# Altium footprint library SMotlaq-PCB_lib.PcbLib: 186 footprints (part 3 of 12)
Each footprint in its own frame and in the unit in brackets; x right, y up, seen from the top. Pads: shape width x height; smd on the part's side, far side on the other; paste and mask are expansions set on the pad; w line width, h text height; cw(c..) or ccw(c..) is an arc to the next point about the centre after c.
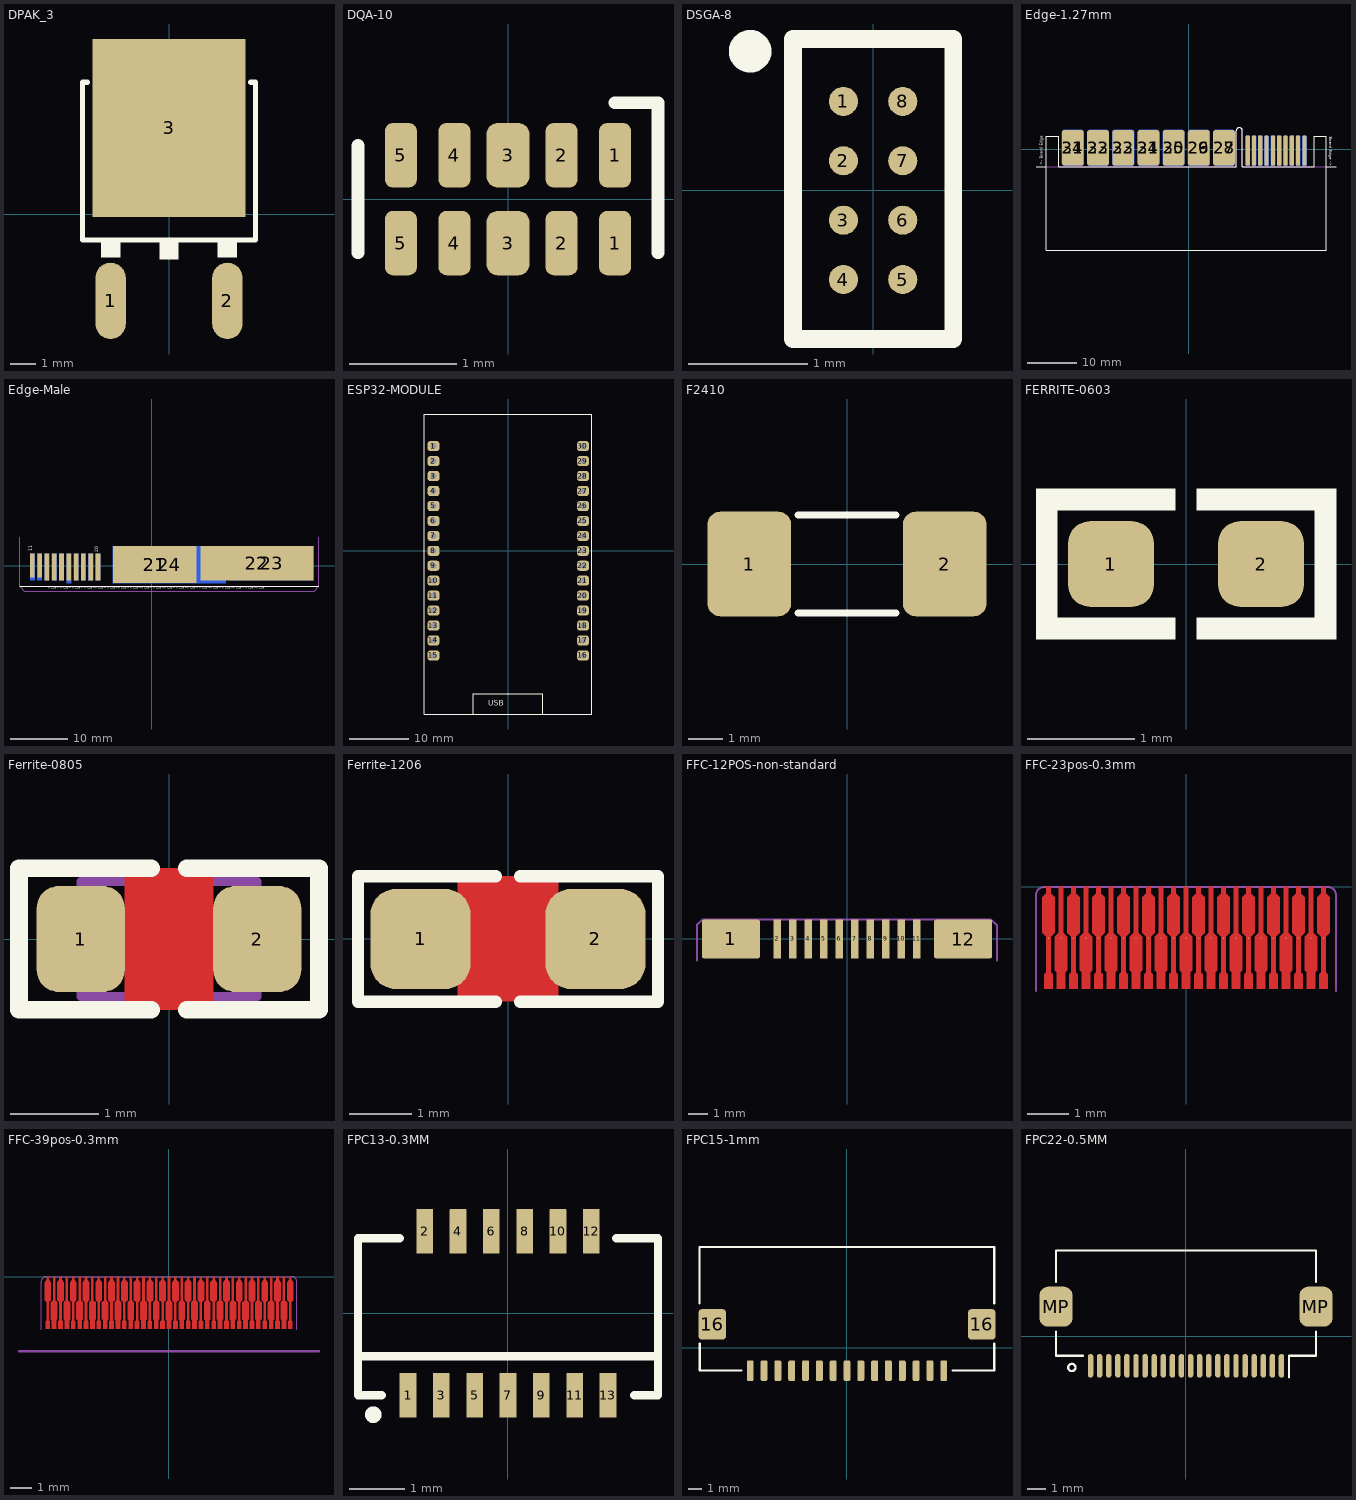
[diagram p2: the footprints below, top view; thin cyan lines are the x and y axes]

## DPAK_3 [mm] "D-PAK (TO-252), 3-Pads, Body 6.2x6.7mm"
height 2.4
pads (3):
  oval 1.2x3 smd: 1(-2.3,-3.4) 2(2.3,-3.4)
  rect 6x7 smd paste-5: 3(0,3.4)
Top Overlay:
  rectangle: 1.905,-1.7 2.667,-1.006
  rectangle: -2.667,-1.7 -1.905,-1.006
  rectangle: -0.381,-1.768 0.381,-1.006
  lines w0.2: -3.2,5.2 -3.4,5.2 -3.4,-1 3.4,-1 3.4,5.2 3.2,5.2
Top Paste:
  rectangle: 0.2,1.5 1.2,2.5
  region: 1.2,2.9 1.2,3.9 0.2,3.9 0.2,2.9
  region: 2.6,2.5 1.6,2.5 1.6,1.5 2.6,1.5
  region: 1.2,1.1 0.2,1.1 0.2,0.1 1.2,0.1
  region: 2.6,0.1 2.6,1.1 1.6,1.1 1.6,0.1
  region: 1.6,3.9 1.6,2.9 2.6,2.9 2.6,3.9
  region: 2.6,4.3 2.6,5.3 1.6,5.3 1.6,4.3
  region: 1.2,5.3 0.2,5.3 0.2,4.3 1.2,4.3
  region: 2.6,6.7 1.6,6.7 1.6,5.7 2.6,5.7
  rectangle: 0.2,5.7 1.2,6.7
  region: -0.2,6.7 -1.2,6.7 -1.2,5.7 -0.2,5.7
  rectangle: -2.6,5.7 -1.6,6.7
  rectangle: -1.2,4.3 -0.2,5.3
  region: -1.6,4.3 -1.6,5.3 -2.6,5.3 -2.6,4.3
  region: -2.6,3.9 -2.6,2.9 -1.6,2.9 -1.6,3.9
  region: -1.6,0.1 -1.6,1.1 -2.6,1.1 -2.6,0.1
  rectangle: -1.2,0.1 -0.2,1.1
  rectangle: -2.6,1.5 -1.6,2.5
  region: -0.2,2.9 -0.2,3.9 -1.2,3.9 -1.2,2.9
  region: -0.2,2.5 -1.2,2.5 -1.2,1.5 -0.2,1.5
3D body "User Library-DPAK_TO-252AA.step": height 2.37, standoff -0.03, extent -3.367,-3.898 3.367,6.202

## DQA-10 [mm]
pads (10):
  rrect50% 0.3x0.6 smd: 1(1,-0.41) 1(1,0.41) 2(0.5,-0.41) 2(0.5,0.41) 4(-0.5,-0.41) 4(-0.5,0.41) 5(-1,-0.41) 5(-1,0.41)
  rrect50% 0.4x0.6 smd: 3(0,-0.41) 3(0,0.41)
Top Overlay:
  lines w0.12: -1.4,-0.5 -1.4,0.5 ; 1,0.9 1.4,0.9 1.4,-0.5
3D body "User Library-UDFN10.STEP": height 0.52, standoff -0.03, extent -1.25,-0.505 1.25,0.505

## DSGA-8 [mm]
pads (8):
  round 0.245 smd mask+0.1: 1(-0.25,0.75) 2(-0.25,0.25) 3(-0.25,-0.25) 4(-0.25,-0.75) 5(0.25,-0.75) 6(0.25,-0.25) 7(0.25,0.25) 8(0.25,0.75)
Top Overlay:
  circle w0.2: c-1.035,1.172 r0.079
  lines w0.15: -0.675,-1.25 -0.675,1.275 0.675,1.275 0.675,-1.25 -0.675,-1.25
3D body "TMP421YZDR.stp": height 0.63, standoff 0, extent -0.499,-1.088 0.499,1.1

## Edge-1.27mm [mm]
pads (34):
  rrect50% 0.85x6.05 smd far side: 1(11.91,-0.287) 2(13.18,-0.287) 3(14.45,-0.287) 4(15.72,-0.287) 5(16.99,-0.287) 6(18.26,-0.287) 7(19.53,-0.287) 8(20.8,-0.287) 9(22.07,-0.287) 10(23.34,-0.287)
  rrect50% 0.85x6.05 smd: 11(23.34,-0.287) 12(22.07,-0.287) 13(20.8,-0.287) 14(19.53,-0.287) 15(18.26,-0.287) 16(16.99,-0.287) 17(15.72,-0.287) 18(14.45,-0.287) 19(13.18,-0.287) 20(11.91,-0.287)
  rrect25% 4.38x7.2 smd: 21(-23.34,0.288) 22(-18.26,0.288) 23(-13.18,0.288) 24(-8.1,0.288) 25(-3.02,0.288) 26(2.06,0.288) 27(7.14,0.288)
  rrect25% 4.38x7.2 smd far side: 28(7.14,0.288) 29(2.06,0.288) 30(-3.02,0.288) 31(-8.1,0.288) 32(-13.18,0.288) 33(-18.26,0.288) 34(-23.34,0.288)
Top Overlay:
  lines w0.15: -30.765,-3.587 -28.765,-3.587 ; 25.31,-3.587 10.86,-3.587 10.86,3.688 ccw(c10.235,3.688) 10.235,4.313 10.21,4.313 ccw(c10.21,3.688) 9.585,3.688 9.585,-3.587 -26.165,-3.587 -26.165,2.563 -28.74,2.563 -28.74,-3.537 -28.74,-20.362 27.71,-20.362 27.71,-3.537 27.71,2.563 25.31,2.563 25.31,-3.537 ; 27.71,-3.587 29.71,-3.587
  text "<- Board Edge" at -29.228,-3.229 h1
  text "Board Edge ->" at 28.173,2.463 h1
Mechanical 1:
  lines w0.15: -28.74,-3.587 9.585,-3.587 9.585,3.688 cw(c10.21,3.688) 10.21,4.313 10.235,4.313 cw(c10.235,3.688) 10.86,3.688 10.86,-3.587 27.71,-3.587
3D body "c-2204798-1-a-3d.stp": height 2.97, standoff -4.28, extent -28.71,-20.363 27.73,1.837

## Edge-Male [mm]
pads (24):
  rect 0.8x4.63 smd far side paste-2539.97: 1(-9.37,-0.2) 2(-10.64,-0.2) 3(-11.91,-0.2) 4(-13.18,-0.2) 6(-15.72,-0.2) 7(-16.99,-0.2) 8(-18.26,-0.2) 9(-19.53,-0.2) 10(-20.8,-0.2)
  rect 0.8x5.13 smd far side paste-2539.97: 5(-14.45,-0.45)
  rect 0.8x4.13 smd paste-2539.97: 11(-20.8,0.05) 12(-19.53,0.05)
  rect 0.8x4.63 smd paste-2539.97: 13(-18.26,-0.2) 14(-16.99,-0.2) 15(-15.72,-0.2) 16(-14.45,-0.2) 17(-13.18,-0.2) 18(-11.91,-0.2) 19(-10.64,-0.2) 20(-9.37,-0.2)
  rect 14.54x6.43 smd paste-2539.97: 21(0.48,0.2)
  rect 19.62x5.93 smd paste-2539.97: 22(18.26,0.45)
  rect 14.54x5.93 smd far side paste-2539.97: 23(20.8,0.45)
  rect 19.62x6.43 smd far side paste-2539.97: 24(3.02,0.2)
Top Overlay:
  lines w0.15: -23.02,-3.515 29.06,-3.515
  text "V Cut -- V Cut -- V Cut -- V Cut --V Cut -- V Cut --V Cut -- V Cut --V Cut -- V Cut --V Cut -- V Cut --V Cut -- V Cut --V Cut -- V Cut --V Cut -- V Cut --V Cut" at -18.051,-4.152 h0.7
  text "20" at -9.101,2.389 h1
  text "11" at -20.515,2.583 h1
Bottom Overlay:
  lines w0.15: -23.02,-3.515 29.06,-3.515
  text "1" at -9.065,2.965 h1
  text "10" at -20.526,3.415 h1
  text "V Cut -- V Cut -- V Cut -- V Cut --V Cut -- V Cut --V Cut -- V Cut --V Cut -- V Cut --V Cut -- V Cut --V Cut -- V Cut --V Cut -- V Cut --V Cut -- V Cut --V Cut" at 24.096,-4.152 h0.7
Mechanical 1:
  lines w0.15: -23.015,5.015 -23.015,-3.535 -22.165,-4.385 28.21,-4.385 29.06,-3.535 29.06,5.015

## ESP32-MODULE [mm]
pads (30):
  rrect50% 2x1.7 hole 1: 1(-12.7,17.78) 2(-12.7,15.24) 3(-12.7,12.7) 4(-12.7,10.16) 5(-12.7,7.62) 6(-12.7,5.08) 7(-12.7,2.54) 8(-12.7,0) 9(-12.7,-2.54) 10(-12.7,-5.08) 11(-12.7,-7.62) 12(-12.7,-10.16) 13(-12.7,-12.7) 14(-12.7,-15.24) 15(-12.7,-17.78) 16(12.7,-17.78) 17(12.7,-15.24) 18(12.7,-12.7) 19(12.7,-10.16) 20(12.7,-7.62) 21(12.7,-5.08) 22(12.7,-2.54) 23(12.7,0) 24(12.7,2.54) 25(12.7,5.08) 26(12.7,7.62) 27(12.7,10.16) 28(12.7,12.7) 29(12.7,15.24) 30(12.7,17.78)
Top Overlay:
  lines w0.2: -5.9,-27.705 -5.9,-24.28 5.825,-24.28 5.825,-27.705 ; -14.275,-27.73 14.2,-27.73 14.2,23.245 -14.25,23.245 -14.25,-27.73 -14.275,-27.73
  text "USB" at -3.43,-26.637 h1.6
3D body "User Library-ESP32-DOIT-V1.STEP": height 7.2, standoff -5.2, extent -14.275,-27.708 14.225,23.223

## F2410 [mm] "FUSE, 6x2.5mm"
height 2.2
pads (2):
  rrect30% 2.4x3 smd paste-0.2 mask+0.1: 1(-2.8,0) 2(2.8,0)
Top Overlay:
  lines w0.2: -1.4,-1.4 1.4,-1.4 ; -1.4,1.4 1.4,1.4
3D body "User Library-Fuse-2410.step": height 2.34, standoff -0.2, extent -3.05,-1.27 3.05,1.27
3D body "User Library-2410 fuse.step": height 2.18, standoff 0.02, extent -3.09,-1.25 3.09,1.25

## FERRITE-0603 [mm]
pads (2):
  rrect50% 0.8x0.8 smd paste-5 mask+0.075: 1(-0.7,0) 2(0.7,0)
Top Overlay:
  region: -0.1,-0.5 -0.1,-0.7 -1.4,-0.7 -1.4,-0.5
  region: -0.1,0.5 -0.1,0.7 -1.4,0.7 -1.4,0.5
  region: -1.4,0.7 -1.2,0.7 -1.2,-0.7 -1.4,-0.7
  region: 1.4,0.7 1.2,0.7 1.2,-0.7 1.4,-0.7
  region: 0.1,0.5 0.1,0.7 1.4,0.7 1.4,0.5
  region: 0.1,-0.5 0.1,-0.7 1.4,-0.7 1.4,-0.5
Top Paste:
  region: -0.7,0.35 -0.63,0.35 -0.502,0.297 -0.403,0.198 -0.35,0.07 -0.35,0 -0.35,-0.07 -0.403,-0.198 -0.502,-0.297 -0.63,-0.35 -0.7,-0.35 -0.9,-0.35 -0.93,-0.35 -0.985,-0.327 -1.027,-0.285 -1.05,-0.23 -1.05,-0.2 -1.05,0.2 -1.05,0.23 -1.027,0.285 -0.985,0.327 -0.93,0.35 -0.9,0.35
  region: 0.7,0.35 0.63,0.35 0.502,0.297 0.403,0.198 0.35,0.07 0.35,0 0.35,-0.07 0.403,-0.198 0.502,-0.297 0.63,-0.35 0.7,-0.35 0.9,-0.35 0.93,-0.35 0.985,-0.327 1.027,-0.285 1.05,-0.23 1.05,-0.2 1.05,0.2 1.05,0.23 1.027,0.285 0.985,0.327 0.93,0.35 0.9,0.35
3D body "User Library-FB_1608.STEP": height 0.8, standoff 0, extent -0.8,-0.4 0.8,0.4

## Ferrite-0805 [mm]
pads (2):
  rrect50% 1x1.2 smd paste-5 mask+0.075: 1(-1,0) 2(1,0)
Top Layer:
  pour cut-out: -0.5,0.8 0.5,0.8 0.5,-0.8 -0.5,-0.8
Top Overlay:
  lines w0.2: -0.2,-0.8 -1.7,-0.8 -1.7,0.8 -0.2,0.8 ; 0.2,-0.8 1.7,-0.8 1.7,0.8 0.2,0.8
Top Paste:
  region: -0.9,0.5 -0.82,0.5 -0.673,0.439 -0.561,0.327 -0.5,0.18 -0.5,0.1 -0.5,-0.1 -0.5,-0.18 -0.561,-0.327 -0.673,-0.439 -0.82,-0.5 -0.9,-0.5 -1.15,-0.5 -1.18,-0.5 -1.235,-0.477 -1.277,-0.435 -1.3,-0.38 -1.3,-0.35 -1.3,0.35 -1.3,0.38 -1.277,0.435 -1.235,0.477 -1.18,0.5 -1.15,0.5
  region: 0.9,0.5 0.82,0.5 0.673,0.439 0.561,0.327 0.5,0.18 0.5,0.1 0.5,-0.1 0.5,-0.18 0.561,-0.327 0.673,-0.439 0.82,-0.5 0.9,-0.5 1.15,-0.5 1.18,-0.5 1.235,-0.477 1.277,-0.435 1.3,-0.38 1.3,-0.35 1.3,0.35 1.3,0.38 1.277,0.435 1.235,0.477 1.18,0.5 1.15,0.5
Mechanical 13:
  lines w0.1: -1,-0.65 -1,0.65 1,0.65 1,-0.65 -1,-0.65
3D body "User Library-FB_2012.STEP": height 0.85, standoff 0, extent -1,-0.625 1,0.625

## Ferrite-1206 [mm]
pads (2):
  rrect50% 1.6x1.6 smd paste-5 mask+0.075: 1(-1.4,0) 2(1.4,0)
Top Layer:
  pour cut-out: -0.8,1 -0.8,-1 0.8,-1 0.8,1
Top Overlay:
  lines w0.2: -2.4,-1 -0.2,-1 ; -2.4,-1 -2.4,1 -0.2,1 ; 0.2,-1 2.4,-1 ; 0.2,1 2.4,1 2.4,-1
Top Paste:
  region: 1.15,0.7 1.1,0.7 1.008,0.662 0.938,0.592 0.9,0.5 0.9,0.45 0.9,-0.45 0.9,-0.5 0.938,-0.592 1.008,-0.662 1.1,-0.7 1.15,-0.7 1.625,-0.7 1.68,-0.7 1.781,-0.658 1.858,-0.581 1.9,-0.48 1.9,-0.425 1.9,0.45 1.9,0.5 1.862,0.592 1.792,0.662 1.7,0.7 1.65,0.7
  region: -1.15,0.7 -1.1,0.7 -1.008,0.662 -0.938,0.592 -0.9,0.5 -0.9,0.45 -0.9,-0.45 -0.9,-0.5 -0.938,-0.592 -1.008,-0.662 -1.1,-0.7 -1.15,-0.7 -1.625,-0.7 -1.68,-0.7 -1.781,-0.658 -1.858,-0.581 -1.9,-0.48 -1.9,-0.425 -1.9,0.45 -1.9,0.5 -1.862,0.592 -1.792,0.662 -1.7,0.7 -1.65,0.7
3D body "User Library-ind_1206.step": height 1.1, standoff 0, extent -1.6,-0.8 1.6,0.8

## FFC-12POS-non-standard [mm]
pads (12):
  rrect10% 3x2 smd paste-2539.97 mask+0.1: 1(-6,0) 12(6,0)
  rrect10% 0.4x2 smd paste-2539.97 mask+0.1: 2(-3.6,0) 3(-2.8,0) 4(-2,0) 5(-1.2,0) 6(-0.4,0) 7(0.4,0) 8(1.2,0) 9(2,0) 10(2.8,0) 11(3.6,0)
Mechanical 1:
  lines w0.1: -7.75,-1.1 -7.75,0.725 -7.475,1 7.45,1 7.75,0.7 7.75,-1.1

## FFC-23pos-0.3mm [mil]
pads (23):
  round 1 smd paste-99999 mask+0: 1(-129.92,-48.23) 2(-118.11,-48.23) 3(-106.3,-48.23) 4(-94.49,-48.23) 5(-82.68,-48.23) 6(-70.87,-48.23) 7(-59.05,-48.23) 8(-47.24,-48.23) 9(-35.43,-48.23) 10(-23.62,-48.23) 11(-11.81,-48.23) 12(0,-48.23) 13(11.81,-48.23) 14(23.62,-48.23) 15(35.43,-48.23) 16(47.24,-48.23) 17(59.06,-48.23) 18(70.87,-48.23) 19(82.68,-48.23) 20(94.49,-48.23) 21(106.3,-48.23) 22(118.11,-48.23) 23(129.92,-48.23)
Top Layer:
  region: -133.86,-96.46 -125.98,-96.46 -125.98,-82.68 -127.95,-80.71 -127.95,-47.24 -124.02,-43.31 -124.02,-9.84 -127.95,-5.91 -127.95,0 -131.89,0 -131.89,-5.91 -135.83,-9.84 -135.83,-43.31 -131.89,-47.24 -131.89,-80.71 -133.86,-82.68
  region: -122.05,-96.46 -114.17,-96.46 -114.17,-80.71 -112.2,-78.74 -112.2,-47.24 -116.14,-43.31 -116.14,0 -120.08,0 -120.08,-43.31 -124.02,-47.24 -124.02,-78.74 -122.05,-80.71
  region: -110.24,-96.46 -102.36,-96.46 -102.36,-82.68 -104.33,-80.71 -104.33,-47.24 -100.39,-43.31 -100.39,-9.84 -104.33,-5.91 -104.33,0 -108.27,0 -108.27,-5.91 -112.2,-9.84 -112.2,-43.31 -108.27,-47.24 -108.27,-80.71 -110.24,-82.68
  region: -98.43,-96.46 -90.55,-96.46 -90.55,-80.71 -88.58,-78.74 -88.58,-47.24 -92.52,-43.31 -92.52,0 -96.46,0 -96.46,-43.31 -100.39,-47.24 -100.39,-78.74 -98.43,-80.71
  region: -86.61,-96.46 -78.74,-96.46 -78.74,-82.68 -80.71,-80.71 -80.71,-47.24 -76.77,-43.31 -76.77,-9.84 -80.71,-5.91 -80.71,0 -84.65,0 -84.65,-5.91 -88.58,-9.84 -88.58,-43.31 -84.65,-47.24 -84.65,-80.71 -86.61,-82.68
  region: -74.8,-96.46 -66.93,-96.46 -66.93,-80.71 -64.96,-78.74 -64.96,-47.24 -68.9,-43.31 -68.9,0 -72.83,0 -72.83,-43.31 -76.77,-47.24 -76.77,-78.74 -74.8,-80.71
  region: -62.99,-96.46 -55.12,-96.46 -55.12,-82.68 -57.09,-80.71 -57.09,-47.24 -53.15,-43.31 -53.15,-9.84 -57.09,-5.91 -57.09,0 -61.02,0 -61.02,-5.91 -64.96,-9.84 -64.96,-43.31 -61.02,-47.24 -61.02,-80.71 -62.99,-82.68
  region: -51.18,-96.46 -43.31,-96.46 -43.31,-80.71 -41.34,-78.74 -41.34,-47.24 -45.28,-43.31 -45.28,0 -49.21,0 -49.21,-43.31 -53.15,-47.24 -53.15,-78.74 -51.18,-80.71
  region: -39.37,-96.46 -31.5,-96.46 -31.5,-82.68 -33.46,-80.71 -33.46,-47.24 -29.53,-43.31 -29.53,-9.84 -33.46,-5.91 -33.46,0 -37.4,0 -37.4,-5.91 -41.34,-9.84 -41.34,-43.31 -37.4,-47.24 -37.4,-80.71 -39.37,-82.68
  region: -27.56,-96.46 -19.68,-96.46 -19.68,-80.71 -17.72,-78.74 -17.72,-47.24 -21.65,-43.31 -21.65,0 -25.59,0 -25.59,-43.31 -29.53,-47.24 -29.53,-78.74 -27.56,-80.71
  region: -15.75,-96.46 -7.87,-96.46 -7.87,-82.68 -9.84,-80.71 -9.84,-47.24 -5.91,-43.31 -5.91,-9.84 -9.84,-5.91 -9.84,0 -13.78,0 -13.78,-5.91 -17.72,-9.84 -17.72,-43.31 -13.78,-47.24 -13.78,-80.71 -15.75,-82.68
  region: -3.94,-96.46 3.94,-96.46 3.94,-80.71 5.91,-78.74 5.91,-47.24 1.97,-43.31 1.97,0 -1.97,0 -1.97,-43.31 -5.91,-47.24 -5.91,-78.74 -3.94,-80.71
  region: 7.87,-96.46 15.75,-96.46 15.75,-82.68 13.78,-80.71 13.78,-47.24 17.72,-43.31 17.72,-9.84 13.78,-5.91 13.78,0 9.84,0 9.84,-5.91 5.91,-9.84 5.91,-43.31 9.84,-47.24 9.84,-80.71 7.87,-82.68
  region: 19.69,-96.46 27.56,-96.46 27.56,-80.71 29.53,-78.74 29.53,-47.24 25.59,-43.31 25.59,0 21.65,0 21.65,-43.31 17.72,-47.24 17.72,-78.74 19.69,-80.71
  region: 31.5,-96.46 39.37,-96.46 39.37,-82.68 37.4,-80.71 37.4,-47.24 41.34,-43.31 41.34,-9.84 37.4,-5.91 37.4,0 33.46,0 33.46,-5.91 29.53,-9.84 29.53,-43.31 33.46,-47.24 33.46,-80.71 31.5,-82.68
  region: 43.31,-96.46 51.18,-96.46 51.18,-80.71 53.15,-78.74 53.15,-47.24 49.21,-43.31 49.21,0 45.28,0 45.28,-43.31 41.34,-47.24 41.34,-78.74 43.31,-80.71
  region: 55.12,-96.46 62.99,-96.46 62.99,-82.68 61.02,-80.71 61.02,-47.24 64.96,-43.31 64.96,-9.84 61.02,-5.91 61.02,0 57.09,0 57.09,-5.91 53.15,-9.84 53.15,-43.31 57.09,-47.24 57.09,-80.71 55.12,-82.68
  region: 66.93,-96.46 74.8,-96.46 74.8,-80.71 76.77,-78.74 76.77,-47.24 72.83,-43.31 72.83,0 68.9,0 68.9,-43.31 64.96,-47.24 64.96,-78.74 66.93,-80.71
  region: 78.74,-96.46 86.61,-96.46 86.61,-82.68 84.65,-80.71 84.65,-47.24 88.58,-43.31 88.58,-9.84 84.65,-5.91 84.65,0 80.71,0 80.71,-5.91 76.77,-9.84 76.77,-43.31 80.71,-47.24 80.71,-80.71 78.74,-82.68
  region: 90.55,-96.46 98.43,-96.46 98.43,-80.71 100.39,-78.74 100.39,-47.24 96.46,-43.31 96.46,0 92.52,0 92.52,-43.31 88.58,-47.24 88.58,-78.74 90.55,-80.71
  region: 102.36,-96.46 110.24,-96.46 110.24,-82.68 108.27,-80.71 108.27,-47.24 112.21,-43.31 112.21,-9.84 108.27,-5.91 108.27,0 104.33,0 104.33,-5.91 100.39,-9.84 100.39,-43.31 104.33,-47.24 104.33,-80.71 102.36,-82.68
  region: 114.17,-96.46 122.05,-96.46 122.05,-80.71 124.02,-78.74 124.02,-47.24 120.08,-43.31 120.08,0 116.14,0 116.14,-43.31 112.21,-47.24 112.21,-78.74 114.17,-80.71
  region: 125.98,-96.46 133.86,-96.46 133.86,-82.68 131.89,-80.71 131.89,-47.24 135.83,-43.31 135.83,-9.84 131.89,-5.91 131.89,0 127.95,0 127.95,-5.91 124.02,-9.84 124.02,-43.31 127.95,-47.24 127.95,-80.71 125.98,-82.68
Top Solder:
  region: 141.73,-6.89 141.73,-96.46 -141.73,-96.46 -141.73,-7.87 -141.73,-6.31 -140.53,-3.41 -138.32,-1.2 -135.42,0 -133.86,0 134.84,0 136.21,0 138.75,-1.05 140.68,-2.99 141.73,-5.52
Mechanical 1:
  lines w1.97: -141.73,-98.43 -141.73,-7.87 cw(c-133.86,-7.87) -133.86,0 0,0 133.86,0 cw(c133.86,-7.87) 141.73,-7.87 141.73,-98.43

## FFC-39pos-0.3mm [mil]
pads (39):
  round 1 smd paste-99999 mask+0: 1(-224.41,-48.23) 2(-212.6,-48.23) 3(-200.79,-48.23) 4(-188.98,-48.23) 5(-177.17,-48.23) 6(-165.35,-48.23) 7(-153.54,-48.23) 8(-141.73,-48.23) 9(-129.92,-48.23) 10(-118.11,-48.23) 11(-106.3,-48.23) 12(-94.49,-48.23) 13(-82.68,-48.23) 14(-70.87,-48.23) 15(-59.05,-48.23) 16(-47.24,-48.23) 17(-35.43,-48.23) 18(-23.62,-48.23) 19(-11.81,-48.23) 20(0,-48.23) 21(11.81,-48.23) 22(23.62,-48.23) 23(35.43,-48.23) 24(47.24,-48.23) 25(59.06,-48.23) 26(70.87,-48.23) 27(82.68,-48.23) 28(94.49,-48.23) 29(106.3,-48.23) 30(118.11,-48.23) 31(129.92,-48.23) 32(141.73,-48.23) 33(153.54,-48.23) 34(165.36,-48.23) 35(177.17,-48.23) 36(188.98,-48.23) 37(200.79,-48.23) 38(212.6,-48.23) 39(224.41,-48.23)
Top Layer:
  region: -62.99,-96.46 -55.12,-96.46 -55.12,-82.68 -57.09,-80.71 -57.09,-47.24 -53.15,-43.31 -53.15,-9.84 -57.09,-5.91 -57.09,0 -61.02,0 -61.02,-5.91 -64.96,-9.84 -64.96,-43.31 -61.02,-47.24 -61.02,-80.71 -62.99,-82.68
  region: -228.35,-96.46 -220.47,-96.46 -220.47,-82.68 -222.44,-80.71 -222.44,-47.24 -218.5,-43.31 -218.5,-9.84 -222.44,-5.91 -222.44,0 -226.38,0 -226.38,-5.91 -230.31,-9.84 -230.31,-43.31 -226.38,-47.24 -226.38,-80.71 -228.35,-82.68
  region: -216.54,-96.46 -208.66,-96.46 -208.66,-80.71 -206.69,-78.74 -206.69,-47.24 -210.63,-43.31 -210.63,0 -214.57,0 -214.57,-43.31 -218.5,-47.24 -218.5,-78.74 -216.54,-80.71
  region: -204.72,-96.46 -196.85,-96.46 -196.85,-82.68 -198.82,-80.71 -198.82,-47.24 -194.88,-43.31 -194.88,-9.84 -198.82,-5.91 -198.82,0 -202.76,0 -202.76,-5.91 -206.69,-9.84 -206.69,-43.31 -202.76,-47.24 -202.76,-80.71 -204.72,-82.68
  region: -192.91,-96.46 -185.04,-96.46 -185.04,-80.71 -183.07,-78.74 -183.07,-47.24 -187.01,-43.31 -187.01,0 -190.94,0 -190.94,-43.31 -194.88,-47.24 -194.88,-78.74 -192.91,-80.71
  region: -181.1,-96.46 -173.23,-96.46 -173.23,-82.68 -175.2,-80.71 -175.2,-47.24 -171.26,-43.31 -171.26,-9.84 -175.2,-5.91 -175.2,0 -179.13,0 -179.13,-5.91 -183.07,-9.84 -183.07,-43.31 -179.13,-47.24 -179.13,-80.71 -181.1,-82.68
  region: -169.29,-96.46 -161.42,-96.46 -161.42,-80.71 -159.45,-78.74 -159.45,-47.24 -163.39,-43.31 -163.39,0 -167.32,0 -167.32,-43.31 -171.26,-47.24 -171.26,-78.74 -169.29,-80.71
  region: -157.48,-96.46 -149.61,-96.46 -149.61,-82.68 -151.57,-80.71 -151.57,-47.24 -147.64,-43.31 -147.64,-9.84 -151.57,-5.91 -151.57,0 -155.51,0 -155.51,-5.91 -159.45,-9.84 -159.45,-43.31 -155.51,-47.24 -155.51,-80.71 -157.48,-82.68
  region: -145.67,-96.46 -137.8,-96.46 -137.8,-80.71 -135.83,-78.74 -135.83,-47.24 -139.76,-43.31 -139.76,0 -143.7,0 -143.7,-43.31 -147.64,-47.24 -147.64,-78.74 -145.67,-80.71
  region: -133.86,-96.46 -125.98,-96.46 -125.98,-82.68 -127.95,-80.71 -127.95,-47.24 -124.02,-43.31 -124.02,-9.84 -127.95,-5.91 -127.95,0 -131.89,0 -131.89,-5.91 -135.83,-9.84 -135.83,-43.31 -131.89,-47.24 -131.89,-80.71 -133.86,-82.68
  region: -122.05,-96.46 -114.17,-96.46 -114.17,-80.71 -112.2,-78.74 -112.2,-47.24 -116.14,-43.31 -116.14,0 -120.08,0 -120.08,-43.31 -124.02,-47.24 -124.02,-78.74 -122.05,-80.71
  region: -110.24,-96.46 -102.36,-96.46 -102.36,-82.68 -104.33,-80.71 -104.33,-47.24 -100.39,-43.31 -100.39,-9.84 -104.33,-5.91 -104.33,0 -108.27,0 -108.27,-5.91 -112.2,-9.84 -112.2,-43.31 -108.27,-47.24 -108.27,-80.71 -110.24,-82.68
  region: -98.42,-96.46 -90.55,-96.46 -90.55,-80.71 -88.58,-78.74 -88.58,-47.24 -92.52,-43.31 -92.52,0 -96.46,0 -96.46,-43.31 -100.39,-47.24 -100.39,-78.74 -98.42,-80.71
  region: -86.61,-96.46 -78.74,-96.46 -78.74,-82.68 -80.71,-80.71 -80.71,-47.24 -76.77,-43.31 -76.77,-9.84 -80.71,-5.91 -80.71,0 -84.65,0 -84.65,-5.91 -88.58,-9.84 -88.58,-43.31 -84.65,-47.24 -84.65,-80.71 -86.61,-82.68
  region: -74.8,-96.46 -66.93,-96.46 -66.93,-80.71 -64.96,-78.74 -64.96,-47.24 -68.9,-43.31 -68.9,0 -72.83,0 -72.83,-43.31 -76.77,-47.24 -76.77,-78.74 -74.8,-80.71
  region: -51.18,-96.46 -43.31,-96.46 -43.31,-80.71 -41.34,-78.74 -41.34,-47.24 -45.28,-43.31 -45.28,0 -49.21,0 -49.21,-43.31 -53.15,-47.24 -53.15,-78.74 -51.18,-80.71
  region: -39.37,-96.46 -31.5,-96.46 -31.5,-82.68 -33.46,-80.71 -33.46,-47.24 -29.53,-43.31 -29.53,-9.84 -33.46,-5.91 -33.46,0 -37.4,0 -37.4,-5.91 -41.34,-9.84 -41.34,-43.31 -37.4,-47.24 -37.4,-80.71 -39.37,-82.68
  region: -27.56,-96.46 -19.68,-96.46 -19.68,-80.71 -17.72,-78.74 -17.72,-47.24 -21.65,-43.31 -21.65,0 -25.59,0 -25.59,-43.31 -29.53,-47.24 -29.53,-78.74 -27.56,-80.71
  region: -15.75,-96.46 -7.87,-96.46 -7.87,-82.68 -9.84,-80.71 -9.84,-47.24 -5.91,-43.31 -5.91,-9.84 -9.84,-5.91 -9.84,0 -13.78,0 -13.78,-5.91 -17.72,-9.84 -17.72,-43.31 -13.78,-47.24 -13.78,-80.71 -15.75,-82.68
  region: -3.94,-96.46 3.94,-96.46 3.94,-80.71 5.91,-78.74 5.91,-47.24 1.97,-43.31 1.97,0 -1.97,0 -1.97,-43.31 -5.91,-47.24 -5.91,-78.74 -3.94,-80.71
  region: 7.87,-96.46 15.75,-96.46 15.75,-82.68 13.78,-80.71 13.78,-47.24 17.72,-43.31 17.72,-9.84 13.78,-5.91 13.78,0 9.84,0 9.84,-5.91 5.91,-9.84 5.91,-43.31 9.84,-47.24 9.84,-80.71 7.87,-82.68
  region: 19.69,-96.46 27.56,-96.46 27.56,-80.71 29.53,-78.74 29.53,-47.24 25.59,-43.31 25.59,0 21.65,0 21.65,-43.31 17.72,-47.24 17.72,-78.74 19.69,-80.71
  region: 31.5,-96.46 39.37,-96.46 39.37,-82.68 37.4,-80.71 37.4,-47.24 41.34,-43.31 41.34,-9.84 37.4,-5.91 37.4,0 33.47,0 33.47,-5.91 29.53,-9.84 29.53,-43.31 33.47,-47.24 33.47,-80.71 31.5,-82.68
  region: 43.31,-96.46 51.18,-96.46 51.18,-80.71 53.15,-78.74 53.15,-47.24 49.21,-43.31 49.21,0 45.28,0 45.28,-43.31 41.34,-47.24 41.34,-78.74 43.31,-80.71
  region: 55.12,-96.46 62.99,-96.46 62.99,-82.68 61.02,-80.71 61.02,-47.24 64.96,-43.31 64.96,-9.84 61.02,-5.91 61.02,0 57.09,0 57.09,-5.91 53.15,-9.84 53.15,-43.31 57.09,-47.24 57.09,-80.71 55.12,-82.68
  region: 66.93,-96.46 74.8,-96.46 74.8,-80.71 76.77,-78.74 76.77,-47.24 72.84,-43.31 72.84,0 68.9,0 68.9,-43.31 64.96,-47.24 64.96,-78.74 66.93,-80.71
  region: 78.74,-96.46 86.61,-96.46 86.61,-82.68 84.65,-80.71 84.65,-47.24 88.58,-43.31 88.58,-9.84 84.65,-5.91 84.65,0 80.71,0 80.71,-5.91 76.77,-9.84 76.77,-43.31 80.71,-47.24 80.71,-80.71 78.74,-82.68
  region: 90.55,-96.46 98.43,-96.46 98.43,-80.71 100.39,-78.74 100.39,-47.24 96.46,-43.31 96.46,0 92.52,0 92.52,-43.31 88.58,-47.24 88.58,-78.74 90.55,-80.71
  region: 102.36,-96.46 110.24,-96.46 110.24,-82.68 108.27,-80.71 108.27,-47.24 112.21,-43.31 112.21,-9.84 108.27,-5.91 108.27,0 104.33,0 104.33,-5.91 100.39,-9.84 100.39,-43.31 104.33,-47.24 104.33,-80.71 102.36,-82.68
  region: 114.17,-96.46 122.05,-96.46 122.05,-80.71 124.02,-78.74 124.02,-47.24 120.08,-43.31 120.08,0 116.14,0 116.14,-43.31 112.21,-47.24 112.21,-78.74 114.17,-80.71
  region: 125.98,-96.46 133.86,-96.46 133.86,-82.68 131.89,-80.71 131.89,-47.24 135.83,-43.31 135.83,-9.84 131.89,-5.91 131.89,0 127.95,0 127.95,-5.91 124.02,-9.84 124.02,-43.31 127.95,-47.24 127.95,-80.71 125.98,-82.68
  region: 137.8,-96.46 145.67,-96.46 145.67,-80.71 147.64,-78.74 147.64,-47.24 143.7,-43.31 143.7,0 139.76,0 139.76,-43.31 135.83,-47.24 135.83,-78.74 137.8,-80.71
  region: 149.61,-96.46 157.48,-96.46 157.48,-82.68 155.51,-80.71 155.51,-47.24 159.45,-43.31 159.45,-9.84 155.51,-5.91 155.51,0 151.58,0 151.58,-5.91 147.64,-9.84 147.64,-43.31 151.58,-47.24 151.58,-80.71 149.61,-82.68
  region: 161.42,-96.46 169.29,-96.46 169.29,-80.71 171.26,-78.74 171.26,-47.24 167.32,-43.31 167.32,0 163.39,0 163.39,-43.31 159.45,-47.24 159.45,-78.74 161.42,-80.71
  region: 173.23,-96.46 181.1,-96.46 181.1,-82.68 179.13,-80.71 179.13,-47.24 183.07,-43.31 183.07,-9.84 179.13,-5.91 179.13,0 175.2,0 175.2,-5.91 171.26,-9.84 171.26,-43.31 175.2,-47.24 175.2,-80.71 173.23,-82.68
  region: 185.04,-96.46 192.91,-96.46 192.91,-80.71 194.88,-78.74 194.88,-47.24 190.95,-43.31 190.95,0 187.01,0 187.01,-43.31 183.07,-47.24 183.07,-78.74 185.04,-80.71
  region: 196.85,-96.46 204.73,-96.46 204.73,-82.68 202.76,-80.71 202.76,-47.24 206.69,-43.31 206.69,-9.84 202.76,-5.91 202.76,0 198.82,0 198.82,-5.91 194.88,-9.84 194.88,-43.31 198.82,-47.24 198.82,-80.71 196.85,-82.68
  region: 208.66,-96.46 216.54,-96.46 216.54,-80.71 218.5,-78.74 218.5,-47.24 214.57,-43.31 214.57,0 210.63,0 210.63,-43.31 206.69,-47.24 206.69,-78.74 208.66,-80.71
  region: 220.47,-96.46 228.35,-96.46 228.35,-82.68 226.38,-80.71 226.38,-47.24 230.32,-43.31 230.32,-9.84 226.38,-5.91 226.38,0 222.44,0 222.44,-5.91 218.5,-9.84 218.5,-43.31 222.44,-47.24 222.44,-80.71 220.47,-82.68
Top Solder:
  region: 11.81,0 11.81,-96.46 -236.22,-96.46 -236.22,-7.87 -236.22,-6.31 -235.02,-3.41 -232.81,-1.2 -229.91,0 -228.35,0
  region: -11.81,0 -11.81,-96.46 236.22,-96.46 236.22,-7.87 236.22,-6.31 235.02,-3.41 232.81,-1.2 229.91,0 228.35,0
Mechanical 1:
  lines w1.97: -236.22,-98.43 -236.22,-7.87 cw(c-228.35,-7.87) -228.35,0 -94.49,0 0,0 94.49,0 228.35,0 cw(c228.35,-7.87) 236.22,-7.87 236.22,-98.43
Mechanical 4:
  lines w3.94: -277.56,-137.8 0,-137.8 277.56,-137.8
  text "Stiffener" at 276.14,-127.95 h39.37
  text "Stiffener" at -251.42,-127.95 h39.37

## FPC13-0.3MM [mm]
pads (13):
  rrect5% 0.3x0.8 smd: 1(-1.8,-1.475) 2(-1.5,1.475) 3(-1.2,-1.475) 4(-0.9,1.475) 5(-0.6,-1.475) 6(-0.3,1.475) 7(0,-1.475) 8(0.3,1.475) 9(0.6,-1.475) 10(0.9,1.475) 11(1.2,-1.475) 12(1.5,1.475) 13(1.8,-1.475)
Top Overlay:
  circle w0.15: c-2.425,-1.825 r0.075
  lines w0.15: -2.7,-0.775 2.7,-0.775 ; -2.275,-1.475 -2.7,-1.475 -2.7,1.35 -1.95,1.35 ; 1.95,1.35 2.7,1.35 2.7,-1.475 2.275,-1.475
3D body "fh26w-13s-0_3shw_99_.stp": height 1, standoff 0, extent -2.7,-1.85 2.7,1.65

## FPC15-1mm [mm]
pads (17):
  rrect50% 0.5x1.5 smd: 1(-7,-1.675) 2(-6,-1.675) 3(-5,-1.675) 4(-4,-1.675) 5(-3,-1.675) 6(-2,-1.675) 7(-1,-1.675) 8(0,-1.675) 9(1,-1.675) 10(2,-1.675) 11(3,-1.675) 12(4,-1.675) 13(5,-1.675) 14(6,-1.675) 15(7,-1.675)
  rrect25% 2x2.2 smd: 16(-9.75,1.675) 16(9.75,1.675)
Top Overlay:
  lines w0.15: -10.675,3.175 -10.675,7.275 10.65,7.275 10.65,3.175 ; -10.65,0.275 -10.65,-1.65 -7.65,-1.65 ; 7.65,-1.65 10.65,-1.65 10.65,0.275
3D body "52207-1585.step": height 2.7, standoff 0, extent -10.65,-1.65 10.65,7.25

## FPC22-0.5MM [mm] "FH12-20S-0.5SH FFC-FPC pitch: 0.5mm"
height 3
pads (24):
  rrect100% 0.3x1.3 smd: 1(-5.25,-1.625)
  oval 0.3x1.3 smd: 2(-4.75,-1.625) 3(-4.25,-1.625) 4(-3.75,-1.625) 5(-3.25,-1.625) 6(-2.75,-1.625) 7(-2.25,-1.625) 8(-1.75,-1.625) 9(-1.25,-1.625) 10(-0.75,-1.625) 11(-0.25,-1.625) 12(0.25,-1.625) 13(0.75,-1.625) 14(1.25,-1.625) 15(1.75,-1.625) 16(2.25,-1.625) 17(2.75,-1.625) 18(3.25,-1.625) 19(3.75,-1.625) 20(4.25,-1.625) 21(4.75,-1.625) 22(5.25,-1.625)
  rrect50% 1.8x2.2 smd: MP(-7.15,1.625) MP(7.15,1.625)
Top Overlay:
  circle w0.12: c-6.28,-1.715 r0.2
  lines w0.12: -7.15,0.265 -7.15,-1.075 -5.66,-1.075 ; -7.15,2.985 -7.15,4.725 7.15,4.725 7.15,2.985 ; 5.66,-2.275 5.66,-1.075 7.15,-1.075 7.15,0.265
3D body "fh12-22s-0_5sh_55_.stp": height 2.09, standoff -0.01, extent -7.535,-1.788 7.565,4.612